# Altium footprint library TYCO THD.PcbLib: 146 footprints (part 2 of 11) (continued)
## TYCO_1-1734282-3 [mm] "Dual Stacked  Plug Over Receptacle Right Angled D-SUB 15 Pins Connector, With Threaded Insert UNC 4-40, And PCB Mount Retention"
height 31.98
pads (32):
  round 5.5 hole 3.2: 16(-16.65,-3.455) 17(16.65,-3.455)
  round 1.7 hole 1: L1(9.695,2.035) L2(6.925,2.035) L3(4.155,2.035) L4(1.385,2.035) L5(-1.385,2.035) L6(-4.155,2.035) L7(-6.925,2.035) L8(-9.695,2.035) L9(8.31,4.875) L10(5.54,4.875) L11(2.77,4.875) L12(0,4.875) L13(-2.77,4.875) L14(-5.54,4.875) L15(-8.31,4.875) U1(-9.695,-4.875) U2(-6.925,-4.875) U3(-4.155,-4.875) U4(-1.385,-4.875) U5(1.385,-4.875) U6(4.155,-4.875) U7(6.925,-4.875) U8(9.695,-4.875) U9(-8.31,-2.035) U10(-5.54,-2.035) U11(-2.77,-2.035) U12(0,-2.035) U13(2.77,-2.035) U14(5.54,-2.035) U15(8.31,-2.035)
Top Overlay:
  lines w0.2: -19.65,12.455 19.65,12.455 ; -19.6,-4.56 -19.6,-6.545 -13.8,-6.545 -13.8,-4.797 ; -19.6,-2.35 -19.6,10.455 ; -19.6,8.285 -13.6,8.285 ; -19.4,8.285 -19.4,7.085 -13.9,7.085 -13.9,8.285 13.9,8.285 13.9,7.085 19.4,7.085 19.4,8.285 ; -13.8,-2.113 -13.8,1.455 -13.6,1.88 ; -13.6,-4.242 -13.6,-6.695 13.6,-6.695 13.6,-4.242 ; -13.6,-2.668 -13.6,10.455 ; -13.087,12.955 -13.087,17.797 cw(c-12.187,17.797) -12.187,18.697 12.187,18.697 cw(c12.187,17.797) 13.087,17.797 13.087,12.955 ; 13.6,-2.668 13.6,10.455 ; 13.6,1.655 13.8,1.455 13.8,-2.113 ; 13.6,8.285 19.6,8.285 ; 13.8,-4.797 13.8,-6.545 19.6,-6.545 19.6,-4.56 ; 19.6,-2.35 19.6,10.451 ; -19.65,10.455 19.65,10.455 19.65,12.955 -19.65,12.955 -19.65,10.455
  text "15" at 9.881,-2.722 h1.5
  text "8" at 10.946,-5.637 h1.5
  text "1" at -11.779,-5.637 h1.5
  text "9" at -11.566,-2.797 h1.5
  text "15" at -12.041,4.163 h1.5
  text "8" at -12.179,1.273 h1.5
  text "1" at 11.346,1.273 h1.5
  text "9" at 9.881,4.188 h1.5
  text "UPPER" at -2.1,-0.65 h1
  text "LOWER" at -2.1,6.26 h1
Mechanical 8:
  lines w0.1: -19.65,12.955 19.65,12.955 ; -17.15,-3.455 -16.65,-3.455 ; -16.65,-3.955 -16.65,-3.455 ; -16.65,-2.955 -16.65,-3.455 ; -16.15,-3.455 -16.65,-3.455 ; -10.195,-4.875 -9.695,-4.875 ; -10.195,2.035 -9.695,2.035 ; -9.695,-5.375 -9.695,-4.875 ; -9.695,-4.375 -9.695,-4.875 ; -9.695,1.535 -9.695,2.035 ; -9.695,2.535 -9.695,2.035 ; -9.195,-4.875 -9.695,-4.875 ; -9.195,2.035 -9.695,2.035 ; -8.81,-2.035 -8.31,-2.035 ; -8.81,4.875 -8.31,4.875 ; -8.31,-2.535 -8.31,-2.035 ; -8.31,-1.535 -8.31,-2.035 ; -8.31,4.375 -8.31,4.875 ; -8.31,5.375 -8.31,4.875 ; -7.81,-2.035 -8.31,-2.035 ; -7.81,4.875 -8.31,4.875 ; -7.425,-4.875 -6.925,-4.875 ; -7.425,2.035 -6.925,2.035 ; -6.925,-5.375 -6.925,-4.875 ; -6.925,-4.375 -6.925,-4.875 ; -6.925,1.535 -6.925,2.035 ; -6.925,2.535 -6.925,2.035 ; -6.425,-4.875 -6.925,-4.875 ; -6.425,2.035 -6.925,2.035 ; -6.04,-2.035 -5.54,-2.035 ; -6.04,4.875 -5.54,4.875 ; -5.54,-2.535 -5.54,-2.035 ; -5.54,-1.535 -5.54,-2.035 ; -5.54,4.375 -5.54,4.875 ; -5.54,5.375 -5.54,4.875 ; -5.04,-2.035 -5.54,-2.035 ; -5.04,4.875 -5.54,4.875 ; -4.655,-4.875 -4.155,-4.875 ; -4.655,2.035 -4.155,2.035 ; -4.155,-5.375 -4.155,-4.875 ; -4.155,-4.375 -4.155,-4.875 ; -4.155,1.535 -4.155,2.035 ; -4.155,2.535 -4.155,2.035 ; -3.655,-4.875 -4.155,-4.875 ; -3.655,2.035 -4.155,2.035 ; -3.27,-2.035 -2.77,-2.035 ; -3.27,4.875 -2.77,4.875 ; -2.77,-2.535 -2.77,-2.035 ; -2.77,-1.535 -2.77,-2.035 ; -2.77,4.375 -2.77,4.875 ; -2.77,5.375 -2.77,4.875 ; -2.27,-2.035 -2.77,-2.035 ; -2.27,4.875 -2.77,4.875 ; -1.885,-4.875 -1.385,-4.875 ; -1.885,2.035 -1.385,2.035 ; -1.385,-5.375 -1.385,-4.875 ; -1.385,-4.375 -1.385,-4.875 ; -1.385,1.535 -1.385,2.035 ; -1.385,2.535 -1.385,2.035 ; -0.885,-4.875 -1.385,-4.875 ; -0.885,2.035 -1.385,2.035 ; -0.5,-2.035 0,-2.035 ; -0.5,0 0,0 ; -0.5,4.875 0,4.875 ; 0,-2.535 0,-2.035 ; 0,-1.535 0,-2.035 ; 0,-0.5 0,0 ; 0,0.5 0,0 ; 0,4.375 0,4.875 ; 0,5.375 0,4.875 ; 0.5,-2.035 0,-2.035 ; 0.5,0 0,0 ; 0.5,4.875 0,4.875 ; 0.885,-4.875 1.385,-4.875 ; 0.885,2.035 1.385,2.035 ; 1.385,-5.375 1.385,-4.875 ; 1.385,-4.375 1.385,-4.875 ; 1.385,1.535 1.385,2.035 ; 1.385,2.535 1.385,2.035 ; 1.885,-4.875 1.385,-4.875 ; 1.885,2.035 1.385,2.035 ; 2.27,-2.035 2.77,-2.035 ; 2.27,4.875 2.77,4.875 ; 2.77,-2.535 2.77,-2.035 ; 2.77,-1.535 2.77,-2.035 ; 2.77,4.375 2.77,4.875 ; 2.77,5.375 2.77,4.875 ; 3.27,-2.035 2.77,-2.035 ; 3.27,4.875 2.77,4.875 ; 3.655,-4.875 4.155,-4.875 ; 3.655,2.035 4.155,2.035 ; 4.155,-5.375 4.155,-4.875 ; 4.155,-4.375 4.155,-4.875 ; 4.155,1.535 4.155,2.035 ; 4.155,2.535 4.155,2.035 ; 4.655,-4.875 4.155,-4.875 ; 4.655,2.035 4.155,2.035 ; 5.04,-2.035 5.54,-2.035 ; 5.04,4.875 5.54,4.875 ; 5.54,-2.535 5.54,-2.035 ; 5.54,-1.535 5.54,-2.035 ; 5.54,4.375 5.54,4.875 ; 5.54,5.375 5.54,4.875 ; 6.04,-2.035 5.54,-2.035 ; 6.04,4.875 5.54,4.875 ; 6.425,-4.875 6.925,-4.875 ; 6.425,2.035 6.925,2.035 ; 6.925,-5.375 6.925,-4.875 ; 6.925,-4.375 6.925,-4.875 ; 6.925,1.535 6.925,2.035 ; 6.925,2.535 6.925,2.035 ; 7.425,-4.875 6.925,-4.875 ; 7.425,2.035 6.925,2.035 ; 7.81,-2.035 8.31,-2.035 ; 7.81,4.875 8.31,4.875 ; 8.31,-2.535 8.31,-2.035 ; 8.31,-1.535 8.31,-2.035 ; 8.31,4.375 8.31,4.875 ; 8.31,5.375 8.31,4.875 ; 8.81,-2.035 8.31,-2.035 ; 8.81,4.875 8.31,4.875 ; 9.195,-4.875 9.695,-4.875 ; 9.195,2.035 9.695,2.035 ; 9.695,-5.375 9.695,-4.875 ; 9.695,-4.375 9.695,-4.875 ; 9.695,1.535 9.695,2.035 ; 9.695,2.535 9.695,2.035 ; 10.195,-4.875 9.695,-4.875 ; 10.195,2.035 9.695,2.035 ; 16.15,-3.455 16.65,-3.455 ; 16.65,-3.955 16.65,-3.455 ; 16.65,-2.955 16.65,-3.455 ; 17.15,-3.455 16.65,-3.455
  text "PCB EDGE" at -3.725,11.475 h1
Mechanical 14:
  circle w0.1: c16.65,-3.455 r1.25
  circle w0.1: c-16.65,-3.455 r1.25
  lines w0.1: -19.65,12.455 19.65,12.455 ; -19.6,8.285 -13.6,8.285 ; -19.6,10.455 -19.6,-6.545 -13.8,-6.545 -13.8,1.455 -13.6,1.88 ; -19.4,8.285 -19.4,7.085 -13.9,7.085 -13.9,8.285 13.9,8.285 13.9,7.085 19.4,7.085 19.4,8.285 ; -17.76,-4.03 -17.3,-4.03 -17.3,-2.88 -17.76,-2.88 ; -17.225,-4.565 -17.225,-4.105 -16.075,-4.105 -16.075,-4.565 ; -17.225,-2.347 -17.225,-2.805 -16.075,-2.805 -16.075,-2.345 ; -15.542,-4.03 -16,-4.03 -16,-2.88 -15.54,-2.88 ; -13.6,10.455 -13.6,-6.695 13.6,-6.695 13.6,10.455 ; -13.087,12.955 -13.087,17.797 cw(c-12.187,17.797) -12.187,18.697 12.187,18.697 cw(c12.187,17.797) 13.087,17.797 13.087,12.955 ; 13.6,1.655 13.8,1.455 13.8,-6.545 19.6,-6.545 19.6,10.451 ; 13.6,8.285 19.6,8.285 ; 15.54,-4.03 16,-4.03 16,-2.88 15.54,-2.88 ; 16.075,-4.565 16.075,-4.105 17.225,-4.105 17.225,-4.565 ; 16.075,-2.347 16.075,-2.805 17.225,-2.805 17.225,-2.345 ; 17.758,-4.03 17.3,-4.03 17.3,-2.88 17.76,-2.88 ; -19.65,10.455 19.65,10.455 19.65,12.955 -19.65,12.955 -19.65,10.455
  text "UPPER" at -2.1,-0.65 h1
  text "LOWER" at -2.1,6.26 h1
  text "9" at 9.881,4.188 h1.5
  text "1" at 11.346,1.273 h1.5
  text "8" at -12.179,1.273 h1.5
  text "15" at -12.041,4.163 h1.5
  text "9" at -11.566,-2.797 h1.5
  text "1" at -11.779,-5.637 h1.5
  text "8" at 10.946,-5.637 h1.5
  text "15" at 9.881,-2.722 h1.5
3D body "TYCO_1-1734282-3.stp": height 31.7, standoff -3.6, extent -19.65,-6.695 19.65,18.755

## TYCO_1-1734285-3 [mm] "Dual Stacked  Right Angled D-SUB 15 Pins Female Connector, With Threaded Insert UNC 4-40, And PCB Mount Retention"
height 31.9
pads (32):
  round 5.5 hole 3.2: 16(-16.65,-3.455) 17(16.65,-3.455)
  round 1.7 hole 1: L1(-9.695,2.035) L2(-6.925,2.035) L3(-4.155,2.035) L4(-1.385,2.035) L5(1.385,2.035) L6(4.155,2.035) L7(6.925,2.035) L8(9.695,2.035) L9(-8.31,4.875) L10(-5.54,4.875) L11(-2.77,4.875) L12(0,4.875) L13(2.77,4.875) L14(5.54,4.875) L15(8.31,4.875) U1(-9.695,-4.875) U2(-6.925,-4.875) U3(-4.155,-4.875) U4(-1.385,-4.875) U5(1.385,-4.875) U6(4.155,-4.875) U7(6.925,-4.875) U8(9.695,-4.875) U9(-8.31,-2.035) U10(-5.54,-2.035) U11(-2.77,-2.035) U12(0,-2.035) U13(2.77,-2.035) U14(5.54,-2.035) U15(8.31,-2.035)
Top Overlay:
  lines w0.2: -19.65,7.355 -12.9,7.355 ; -19.65,10.355 19.65,10.355 ; -19.35,7.355 -19.35,6.691 -13.95,6.691 -13.95,7.355 ; -17.65,10.355 -17.65,12.955 ; -13.2,12.955 ccw(c-13.2,13.855) -12.3,13.855 ; -12.9,-6.545 -19.65,-6.545 -19.65,12.955 19.65,12.955 19.65,-6.545 12.9,-6.545 ; -12.9,10.355 -12.9,-6.695 12.9,-6.695 12.9,10.355 ; -11.3,18.655 -11.3,18.755 11.3,18.755 11.3,18.655 ; -10.8,12.955 -10.8,18.755 ; 10.8,12.955 10.8,18.755 ; 12.9,7.355 19.65,7.355 ; 13.2,12.955 cw(c13.2,13.855) 12.3,13.855 ; 13.95,7.355 13.95,6.691 19.35,6.691 19.35,7.355 ; 17.65,10.355 17.65,12.955 ; -12.3,13.855 -12.3,17.755 ; -12.3,13.855 12.3,13.855 ; -12.3,17.755 cw(c-11.4,17.755) -11.4,18.655 11.399,18.655 cw(c11.4,17.755) 12.3,17.755 ; -12.3,17.755 12.3,17.755 ; 12.3,13.855 12.3,17.755
  text "15" at 9.881,-2.722 h1.5
  text "8" at 10.946,-5.637 h1.5
  text "1" at -11.454,-5.637 h1.5
  text "9" at -11.566,-2.797 h1.5
  text "9" at -11.566,4.113 h1.5
  text "1" at -11.454,1.273 h1.5
  text "8" at 10.946,1.273 h1.5
  text "15" at 9.881,4.188 h1.5
  text "UPPER" at -2.1,-0.65 h1
  text "LOWER" at -2.1,6.26 h1
Mechanical 8:
  lines w0.1: -10.195,-4.875 -9.695,-4.875 ; -10.195,2.035 -9.695,2.035 ; -9.695,-5.375 -9.695,-4.875 ; -9.695,-4.375 -9.695,-4.875 ; -9.695,1.535 -9.695,2.035 ; -9.695,2.535 -9.695,2.035 ; -9.195,-4.875 -9.695,-4.875 ; -9.195,2.035 -9.695,2.035 ; -8.81,-2.035 -8.31,-2.035 ; -8.81,4.875 -8.31,4.875 ; -8.31,-2.535 -8.31,-2.035 ; -8.31,-1.535 -8.31,-2.035 ; -8.31,4.375 -8.31,4.875 ; -8.31,5.375 -8.31,4.875 ; -7.81,-2.035 -8.31,-2.035 ; -7.81,4.875 -8.31,4.875 ; -7.425,-4.875 -6.925,-4.875 ; -7.425,2.035 -6.925,2.035 ; -6.925,-5.375 -6.925,-4.875 ; -6.925,-4.375 -6.925,-4.875 ; -6.925,1.535 -6.925,2.035 ; -6.925,2.535 -6.925,2.035 ; -6.425,-4.875 -6.925,-4.875 ; -6.425,2.035 -6.925,2.035 ; -6.04,-2.035 -5.54,-2.035 ; -6.04,4.875 -5.54,4.875 ; -5.54,-2.535 -5.54,-2.035 ; -5.54,-1.535 -5.54,-2.035 ; -5.54,4.375 -5.54,4.875 ; -5.54,5.375 -5.54,4.875 ; -5.04,-2.035 -5.54,-2.035 ; -5.04,4.875 -5.54,4.875 ; -4.66,-4.875 -4.16,-4.875 ; -4.66,2.035 -4.16,2.035 ; -4.16,-5.375 -4.16,-4.875 ; -4.16,-4.375 -4.16,-4.875 ; -4.16,1.535 -4.16,2.035 ; -4.16,2.535 -4.16,2.035 ; -3.66,-4.875 -4.16,-4.875 ; -3.66,2.035 -4.16,2.035 ; -3.27,-2.035 -2.77,-2.035 ; -3.27,4.875 -2.77,4.875 ; -2.77,-2.535 -2.77,-2.035 ; -2.77,-1.535 -2.77,-2.035 ; -2.77,4.375 -2.77,4.875 ; -2.77,5.375 -2.77,4.875 ; -2.27,-2.035 -2.77,-2.035 ; -2.27,4.875 -2.77,4.875 ; -1.885,-4.875 -1.385,-4.875 ; -1.885,2.035 -1.385,2.035 ; -1.385,-5.375 -1.385,-4.875 ; -1.385,-4.375 -1.385,-4.875 ; -1.385,1.535 -1.385,2.035 ; -1.385,2.535 -1.385,2.035 ; -0.885,-4.875 -1.385,-4.875 ; -0.885,2.035 -1.385,2.035 ; -0.5,-2.035 0,-2.035 ; -0.5,0 0,0 ; -0.5,4.875 0,4.875 ; 0,-2.535 0,-2.035 ; 0,-1.535 0,-2.035 ; 0,-0.5 0,0 ; 0,0.5 0,0 ; 0,4.375 0,4.875 ; 0,5.375 0,4.875 ; 0.5,-2.035 0,-2.035 ; 0.5,0 0,0 ; 0.5,4.875 0,4.875 ; 0.885,-4.875 1.385,-4.875 ; 0.885,2.035 1.385,2.035 ; 1.385,-5.375 1.385,-4.875 ; 1.385,-4.375 1.385,-4.875 ; 1.385,1.535 1.385,2.035 ; 1.385,2.535 1.385,2.035 ; 1.885,-4.875 1.385,-4.875 ; 1.885,2.035 1.385,2.035 ; 2.27,-2.035 2.77,-2.035 ; 2.27,4.875 2.77,4.875 ; 2.77,-2.535 2.77,-2.035 ; 2.77,-1.535 2.77,-2.035 ; 2.77,4.375 2.77,4.875 ; 2.77,5.375 2.77,4.875 ; 3.27,-2.035 2.77,-2.035 ; 3.27,4.875 2.77,4.875 ; 3.655,-4.875 4.155,-4.875 ; 3.655,2.035 4.155,2.035 ; 4.155,-5.375 4.155,-4.875 ; 4.155,-4.375 4.155,-4.875 ; 4.155,1.535 4.155,2.035 ; 4.155,2.535 4.155,2.035 ; 4.655,-4.875 4.155,-4.875 ; 4.655,2.035 4.155,2.035 ; 5.04,-2.035 5.54,-2.035 ; 5.04,4.875 5.54,4.875 ; 5.54,-2.535 5.54,-2.035 ; 5.54,-1.535 5.54,-2.035 ; 5.54,4.375 5.54,4.875 ; 5.54,5.375 5.54,4.875 ; 6.04,-2.035 5.54,-2.035 ; 6.04,4.875 5.54,4.875 ; 6.425,-4.875 6.925,-4.875 ; 6.425,2.035 6.925,2.035 ; 6.925,-5.375 6.925,-4.875 ; 6.925,-4.375 6.925,-4.875 ; 6.925,1.535 6.925,2.035 ; 6.925,2.535 6.925,2.035 ; 7.425,-4.875 6.925,-4.875 ; 7.425,2.035 6.925,2.035 ; 7.81,-2.035 8.31,-2.035 ; 7.81,4.875 8.31,4.875 ; 8.31,-2.535 8.31,-2.035 ; 8.31,-1.535 8.31,-2.035 ; 8.31,4.375 8.31,4.875 ; 8.31,5.375 8.31,4.875 ; 8.81,-2.035 8.31,-2.035 ; 8.81,4.875 8.31,4.875 ; 9.195,-4.875 9.695,-4.875 ; 9.195,2.035 9.695,2.035 ; 9.695,-5.375 9.695,-4.875 ; 9.695,-4.375 9.695,-4.875 ; 9.695,1.535 9.695,2.035 ; 9.695,2.535 9.695,2.035 ; 10.195,-4.875 9.695,-4.875 ; 10.195,2.035 9.695,2.035
Mechanical 14:
  drawing of 6656 lines, arcs and shapes, not listed
  text "UPPER" at -2.1,-0.65 h1
  text "LOWER" at -2.1,6.26 h1
  text "15" at 9.881,4.188 h1.5
  text "8" at 10.946,1.273 h1.5
  text "1" at -11.454,1.273 h1.5
  text "9" at -11.566,4.113 h1.5
  text "9" at -11.566,-2.797 h1.5
  text "1" at -11.454,-5.637 h1.5
  text "8" at 10.946,-5.637 h1.5
  text "15" at 9.881,-2.722 h1.5
3D body "TYCO_1-1734285-3.stp": height 31.6, standoff -3.55, extent -19.65,-6.695 19.65,18.805

## TYCO_1-1734530-1 [mm] "15 Female Contacts, Right Angle High Density D-SUB Connector, AMPLIMITE HD-22 Serie"
height 12.75
pads (17):
  round 1.7 hole 1.2: 1(-4.01,-2.54) 2(-1.72,-2.54) 3(0.57,-2.54) 4(2.86,-2.54) 5(5.15,-2.54) 6(-5.15,0) 7(-2.86,0) 8(-0.57,0) 9(1.72,0) 10(4.01,0) 11(-4.01,2.54) 12(-1.72,2.54) 13(0.57,2.54) 14(2.86,2.54) 15(5.15,2.54)
  round 3.9 hole 3.2: 16(-12.19,0) 17(12.8,0)
Top Overlay:
  lines w0.2: -15.165,7.43 15.785,7.43 ; -15.165,8.43 15.785,8.43 ; -15.09,10.83 -15.09,11.43 15.71,11.43 15.71,10.83 ; -15.04,7.43 -15.04,2.73 -13.79,2.73 -13.79,1.721 ; -14.09,-4.57 -14.09,-1.383 ; -14.09,1.383 -14.09,2.73 ; -14,-1.499 ccw(c-12.19,-0.92) -10.381,-1.499 ; -12.755,2.281 -12.755,2.73 -11.625,2.73 -11.625,2.281 ; -10.59,1.721 -10.59,2.73 -9.34,2.73 -9.34,7.41 ; -10.29,-4.57 -10.29,-1.383 ; -10.29,1.383 -10.29,2.73 ; -9.04,-4.57 -9.04,7.43 ; -7.84,11.43 -7.84,16.54 ; -7.09,17.18 -7.09,17.43 7.71,17.43 7.71,17.18 ; 8.46,11.43 8.46,16.54 ; 9.66,-4.57 9.66,7.43 ; 9.96,7.43 9.96,2.73 11.21,2.73 11.21,1.73 ; 10.91,-4.57 10.91,-1.397 ; 10.91,1.397 10.91,2.73 ; 11.007,-1.519 ccw(c12.81,-0.92) 14.626,-1.48 ; 12.245,2.284 12.245,2.73 13.375,2.73 13.375,2.279 ; 14.41,1.712 14.41,2.73 15.66,2.73 15.66,7.41 ; 14.71,-4.57 14.71,-1.369 ; 14.71,1.369 14.71,2.73 ; -7.84,16.54 cw(c-7.2,16.54) -7.2,17.18 7.82,17.18 cw(c7.82,16.54) 8.46,16.54 ; -7.84,16.54 8.46,16.54 ; -15.165,-4.57 -15.165,10.83 15.785,10.83 15.785,-4.57 -15.165,-4.57
  text "5" at 6.77,-3.24 h1.2
  text "15" at 6.77,1.94 h1.2
  text "10" at 5.69,-0.6 h1.2
  text "6" at -7.72,-0.6 h1.2
  text "11" at -6.834,1.94 h1.2
  text "1" at -6.32,-3.24 h1.2
Mechanical 8:
  circle w0.1: c12.8,0 r1.59
  circle w0.1: c-4.01,2.54 r0.6
  circle w0.1: c-12.19,0 r1.59
  lines w0.1: -12.69,0 -12.19,0 ; -12.19,-0.5 -12.19,0 ; -12.19,0.5 -12.19,0 ; -11.69,0 -12.19,0 ; -5.65,0 -5.15,0 ; -5.15,-0.5 -5.15,0 ; -5.15,0.5 -5.15,0 ; -4.65,0 -5.15,0 ; -4.51,-2.54 -4.01,-2.54 ; -4.51,2.54 -4.01,2.54 ; -4.01,-3.04 -4.01,-2.54 ; -4.01,-2.04 -4.01,-2.54 ; -4.01,2.04 -4.01,2.54 ; -4.01,3.04 -4.01,2.54 ; -3.51,-2.54 -4.01,-2.54 ; -3.51,2.54 -4.01,2.54 ; -3.36,0 -2.86,0 ; -2.86,-0.5 -2.86,0 ; -2.86,0.5 -2.86,0 ; -2.36,0 -2.86,0 ; -2.22,-2.54 -1.72,-2.54 ; -2.22,2.54 -1.72,2.54 ; -1.72,-3.04 -1.72,-2.54 ; -1.72,-2.04 -1.72,-2.54 ; -1.72,2.04 -1.72,2.54 ; -1.72,3.04 -1.72,2.54 ; -1.22,-2.54 -1.72,-2.54 ; -1.22,2.54 -1.72,2.54 ; -1.07,0 -0.57,0 ; -0.57,-0.5 -0.57,0 ; -0.57,0.5 -0.57,0 ; -0.354,-0.354 0,0 ; -0.354,0.354 0,0 ; 0.07,-2.54 0.57,-2.54 ; 0.07,2.54 0.57,2.54 ; 0.354,-0.354 0,0 ; 0.354,0.354 0,0 ; 0.57,-3.04 0.57,-2.54 ; 0.57,-2.04 0.57,-2.54 ; 0.57,2.04 0.57,2.54 ; 0.57,3.04 0.57,2.54 ; 1.07,-2.54 0.57,-2.54 ; 1.07,2.54 0.57,2.54 ; 1.22,0 1.72,0 ; 1.72,-0.5 1.72,0 ; 1.72,0.5 1.72,0 ; 2.22,0 1.72,0 ; 2.36,-2.54 2.86,-2.54 ; 2.36,2.54 2.86,2.54 ; 2.86,-3.04 2.86,-2.54 ; 2.86,-2.04 2.86,-2.54 ; 2.86,2.04 2.86,2.54 ; 2.86,3.04 2.86,2.54 ; 3.36,-2.54 2.86,-2.54 ; 3.36,2.54 2.86,2.54 ; 3.51,0 4.01,0 ; 4.01,-0.5 4.01,0 ; 4.01,0.5 4.01,0 ; 4.51,0 4.01,0 ; 4.65,-2.54 5.15,-2.54 ; 4.65,2.54 5.15,2.54 ; 5.15,-3.04 5.15,-2.54 ; 5.15,-2.04 5.15,-2.54 ; 5.15,2.04 5.15,2.54 ; 5.15,3.04 5.15,2.54 ; 5.65,-2.54 5.15,-2.54 ; 5.65,2.54 5.15,2.54 ; 12.3,0 12.8,0 ; 12.8,-0.5 12.8,0 ; 12.8,0.5 12.8,0 ; 13.3,0 12.8,0
Mechanical 14:
  lines w0.1: -15.165,7.43 15.785,7.43 ; -15.165,8.43 15.785,8.43 ; -15.09,10.83 -15.09,11.43 15.71,11.43 15.71,10.83 ; -15.04,7.43 -15.04,2.73 -13.79,2.73 -13.79,-0.46 ; -14.09,-4.57 -14.09,2.73 ; -14.09,-0.92 ccw(c-12.19,-0.92) -10.29,-0.92 ; -14.09,-0.46 -12.755,-0.46 -12.755,2.73 -11.625,2.73 -11.625,-0.46 -10.29,-0.46 ; -14.09,0.46 -13.79,0.46 ; -10.59,-0.46 -10.59,2.73 -9.34,2.73 -9.34,7.41 ; -10.59,0.46 -10.29,0.46 ; -10.29,-4.57 -10.29,2.73 ; -9.04,-4.57 -9.04,7.43 ; -7.84,11.43 -7.84,16.54 ; -7.09,17.18 -7.09,17.43 7.71,17.43 7.71,17.18 ; 8.46,11.43 8.46,16.54 ; 9.66,-4.57 9.66,7.43 ; 9.96,7.43 9.96,2.73 11.21,2.73 11.21,-0.46 ; 10.91,-4.57 10.91,2.73 ; 10.91,-0.92 ccw(c12.81,-0.92) 14.71,-0.92 ; 10.91,-0.46 12.245,-0.46 12.245,2.73 13.375,2.73 13.375,-0.46 14.71,-0.46 ; 10.91,0.46 11.21,0.46 ; 14.41,-0.46 14.41,2.73 15.66,2.73 15.66,7.41 ; 14.41,0.46 14.71,0.46 ; 14.71,-4.57 14.71,2.73 ; -7.84,16.54 cw(c-7.2,16.54) -7.2,17.18 7.82,17.18 cw(c7.82,16.54) 8.46,16.54 ; -7.84,16.54 8.46,16.54 ; -15.165,-4.57 -15.165,10.83 15.785,10.83 15.785,-4.57 -15.165,-4.57
3D body "TYCO_1-1734530-1.stp": height 12.5, standoff -4.1, extent -15.165,-4.57 15.785,17.48

## TYCO_1-1761685-3 [mm] "40 Contacts, Vertical Low Profile IDC Shrouded Header, with Ejection Latches"
height 9.22
pads (40):
  round 1.6 hole 0.9: 1(-24.13,-1.27) 2(-24.13,1.27) 3(-21.59,-1.27) 4(-21.59,1.27) 5(-19.05,-1.27) 6(-19.05,1.27) 7(-16.51,-1.27) 8(-16.51,1.27) 9(-13.97,-1.27) 10(-13.97,1.27) 11(-11.43,-1.27) 12(-11.43,1.27) 13(-8.89,-1.27) 14(-8.89,1.27) 15(-6.35,-1.27) 16(-6.35,1.27) 17(-3.81,-1.27) 18(-3.81,1.27) 19(-1.27,-1.27) 20(-1.27,1.27) 21(1.27,-1.27) 22(1.27,1.27) 23(3.81,-1.27) 24(3.81,1.27) 25(6.35,-1.27) 26(6.35,1.27) 27(8.89,-1.27) 28(8.89,1.27) 29(11.43,-1.27) 30(11.43,1.27) 31(13.97,-1.27) 32(13.97,1.27) 33(16.51,-1.27) 34(16.51,1.27) 35(19.05,-1.27) 36(19.05,1.27) 37(21.59,-1.27) 38(21.59,1.27) 39(24.13,-1.27) 40(24.13,1.27)
Top Overlay:
  circle w0.3: c-24.125,-5.125 r0.15
  lines w0.2: -34.925,-1.981 -31.261,-1.981 ; -34.925,1.981 -31.261,1.981 ; -27.94,-3.175 -27.94,3.175 ; -26.289,-3.175 -26.289,3.175 ; -26.289,-1.981 -25.4,-1.981 -25.4,1.981 -26.289,1.981 ; -25.682,-1.981 -25.682,1.981 ; -25.4,-3.175 -24.13,-4.318 -22.86,-3.175 ; -2.032,-4.445 -2.032,-2.667 2.032,-2.667 2.032,-4.445 ; -2.032,-3.175 -31.261,-3.175 -31.261,-1.905 -34.11,-1.905 -34.11,1.905 -31.261,1.905 -31.261,3.175 31.261,3.175 31.261,1.905 34.11,1.905 34.11,-1.905 31.261,-1.905 31.261,-3.175 2.032,-3.175 ; 25.682,-1.981 25.682,1.981 ; 26.289,-3.175 26.289,3.175 ; 26.289,-1.981 25.4,-1.981 25.4,1.981 26.289,1.981 ; 27.94,-3.175 27.94,3.175 ; 31.261,-1.981 34.925,-1.981 ; 31.261,1.981 34.925,1.981 ; -34.925,-4.445 -34.925,4.445 -34.131,4.445 cw(c-33.655,4.267) -33.179,4.445 -0.476,4.445 cw(c0,4.267) 0.476,4.445 33.179,4.445 cw(c33.655,4.267) 34.131,4.445 34.925,4.445 34.925,-4.445 -34.925,-4.445
Mechanical 8:
  drawing of 164 lines, arcs and shapes, not listed
Mechanical 14:
  drawing of 205 lines, arcs and shapes, not listed
3D body "TYCO_1-1761685-3.stp": height 17.22, standoff -2.59, extent -34.925,-4.445 34.925,4.775

## TYCO_1-1814655-1 [mm] "16 Positions, Pitch 2.54mm, Width 2.54mm, Heigh 4.4mm, SIP Straight Socket"
height 4.4
pads (16):
  round 1.5 hole 0.8: 1(0,0) 2(2.54,0) 3(5.08,0) 4(7.62,0) 5(10.16,0) 6(12.7,0) 7(15.24,0) 8(17.78,0) 9(20.32,0) 10(22.86,0) 11(25.4,0) 12(27.94,0) 13(30.48,0) 14(33.02,0) 15(35.56,0) 16(38.1,0)
Top Overlay:
  lines w0.2: 1.27,-0.77 1.27,0.77 ; 1.27,-0.77 1.77,-1.27 3.31,-1.27 3.81,-0.77 ; 1.27,-0.77 0.77,-1.27 -0.77,-1.27 -1.27,-0.77 -1.27,0.77 -0.77,1.27 0.77,1.27 1.27,0.77 ; 1.27,0.77 1.77,1.27 3.31,1.27 3.81,0.77 ; 3.81,-0.77 3.81,0.77 ; 3.81,-0.77 4.31,-1.27 5.85,-1.27 6.35,-0.77 ; 3.81,0.77 4.31,1.27 5.85,1.27 6.35,0.77 ; 6.35,-0.77 6.35,0.77 ; 6.35,-0.77 6.85,-1.27 8.39,-1.27 8.89,-0.77 ; 6.35,0.77 6.85,1.27 8.39,1.27 8.89,0.77 ; 8.89,-0.77 8.89,0.77 ; 8.89,-0.77 9.39,-1.27 10.93,-1.27 11.43,-0.77 ; 8.89,0.77 9.39,1.27 10.93,1.27 11.43,0.77 ; 11.43,-0.77 11.43,0.77 ; 11.43,-0.77 11.93,-1.27 13.47,-1.27 13.97,-0.77 ; 11.43,0.77 11.93,1.27 13.47,1.27 13.97,0.77 ; 13.97,-0.77 13.97,0.77 ; 13.97,-0.77 14.47,-1.27 16.01,-1.27 16.51,-0.77 ; 13.97,0.77 14.47,1.27 16.01,1.27 16.51,0.77 ; 16.51,-0.77 16.51,0.77 ; 16.51,-0.77 17.01,-1.27 18.55,-1.27 19.05,-0.77 ; 16.51,0.77 17.01,1.27 18.55,1.27 19.05,0.77 ; 19.05,-0.77 19.05,0.77 ; 19.05,-0.77 19.55,-1.27 21.09,-1.27 21.59,-0.77 ; 19.05,0.77 19.55,1.27 21.09,1.27 21.59,0.77 ; 21.59,-0.77 21.59,0.77 ; 21.59,-0.77 22.09,-1.27 23.63,-1.27 24.13,-0.77 ; 21.59,0.77 22.09,1.27 23.63,1.27 24.13,0.77 ; 24.13,-0.77 24.13,0.77 ; 24.13,-0.77 24.63,-1.27 26.17,-1.27 26.67,-0.77 ; 24.13,0.77 24.63,1.27 26.17,1.27 26.67,0.77 ; 26.67,-0.77 27.17,-1.27 28.71,-1.27 29.21,-0.77 ; 26.67,-0.77 26.67,0.77 ; 26.67,0.77 27.17,1.27 28.71,1.27 29.21,0.77 ; 29.21,-0.77 29.71,-1.27 31.25,-1.27 31.75,-0.77 ; 29.21,-0.77 29.21,0.77 ; 29.21,0.77 29.71,1.27 31.25,1.27 31.75,0.77 ; 31.75,-0.77 32.25,-1.27 33.79,-1.27 34.29,-0.77 ; 31.75,-0.77 31.75,0.77 ; 31.75,0.77 32.25,1.27 33.79,1.27 34.29,0.77 ; 34.29,-0.77 34.29,0.77 ; 34.29,-0.77 34.79,-1.27 36.33,-1.27 36.83,-0.77 ; 34.29,0.77 34.79,1.27 36.33,1.27 36.83,0.77 ; 36.83,-0.77 36.83,0.77 ; 36.83,-0.77 37.33,-1.27 38.87,-1.27 39.37,-0.77 39.37,0.77 38.87,1.27 37.33,1.27 36.83,0.77
Mechanical 8:
  lines w0.1: -1,0 0,0 ; 0,-1 0,0 ; 0,1 0,0 ; 1,0 0,0 ; 1.54,0 2.54,0 ; 2.54,-1 2.54,0 ; 2.54,1 2.54,0 ; 3.54,0 2.54,0 ; 4.08,0 5.08,0 ; 5.08,-1 5.08,0 ; 5.08,1 5.08,0 ; 6.08,0 5.08,0 ; 6.62,0 7.62,0 ; 7.62,-1 7.62,0 ; 7.62,1 7.62,0 ; 8.62,0 7.62,0 ; 9.16,0 10.16,0 ; 10.16,-1 10.16,0 ; 10.16,1 10.16,0 ; 11.16,0 10.16,0 ; 11.7,0 12.7,0 ; 12.7,-1 12.7,0 ; 12.7,1 12.7,0 ; 13.7,0 12.7,0 ; 14.24,0 15.24,0 ; 15.24,-1 15.24,0 ; 15.24,1 15.24,0 ; 16.24,0 15.24,0 ; 16.78,0 17.78,0 ; 17.78,-1 17.78,0 ; 17.78,1 17.78,0 ; 18.78,0 17.78,0 ; 19.32,0 20.32,0 ; 20.32,-1 20.32,0 ; 20.32,1 20.32,0 ; 21.32,0 20.32,0 ; 21.86,0 22.86,0 ; 22.86,-1 22.86,0 ; 22.86,1 22.86,0 ; 23.86,0 22.86,0 ; 24.4,0 25.4,0 ; 25.4,-1 25.4,0 ; 25.4,1 25.4,0 ; 26.4,0 25.4,0 ; 26.94,0 27.94,0 ; 27.94,-1 27.94,0 ; 27.94,1 27.94,0 ; 28.94,0 27.94,0 ; 29.48,0 30.48,0 ; 30.48,-1 30.48,0 ; 30.48,1 30.48,0 ; 31.48,0 30.48,0 ; 32.02,0 33.02,0 ; 33.02,-1 33.02,0 ; 33.02,1 33.02,0 ; 34.02,0 33.02,0 ; 34.56,0 35.56,0 ; 35.56,-1 35.56,0 ; 35.56,1 35.56,0 ; 36.56,0 35.56,0 ; 37.1,0 38.1,0 ; 38.1,-1 38.1,0 ; 38.1,1 38.1,0 ; 39.1,0 38.1,0
Mechanical 14:
  lines w0.1: 1.27,-0.77 1.27,0.77 ; 1.27,-0.77 1.77,-1.27 3.31,-1.27 3.81,-0.77 ; 1.27,-0.77 0.77,-1.27 -0.77,-1.27 -1.27,-0.77 -1.27,0.77 -0.77,1.27 0.77,1.27 1.27,0.77 ; 1.27,0.77 1.77,1.27 3.31,1.27 3.81,0.77 ; 3.81,-0.77 3.81,0.77 ; 3.81,-0.77 4.31,-1.27 5.85,-1.27 6.35,-0.77 ; 3.81,0.77 4.31,1.27 5.85,1.27 6.35,0.77 ; 6.35,-0.77 6.35,0.77 ; 6.35,-0.77 6.85,-1.27 8.39,-1.27 8.89,-0.77 ; 6.35,0.77 6.85,1.27 8.39,1.27 8.89,0.77 ; 8.89,-0.77 8.89,0.77 ; 8.89,-0.77 9.39,-1.27 10.93,-1.27 11.43,-0.77 ; 8.89,0.77 9.39,1.27 10.93,1.27 11.43,0.77 ; 11.43,-0.77 11.43,0.77 ; 11.43,-0.77 11.93,-1.27 13.47,-1.27 13.97,-0.77 ; 11.43,0.77 11.93,1.27 13.47,1.27 13.97,0.77 ; 13.97,-0.77 13.97,0.77 ; 13.97,-0.77 14.47,-1.27 16.01,-1.27 16.51,-0.77 ; 13.97,0.77 14.47,1.27 16.01,1.27 16.51,0.77 ; 16.51,-0.77 16.51,0.77 ; 16.51,-0.77 17.01,-1.27 18.55,-1.27 19.05,-0.77 ; 16.51,0.77 17.01,1.27 18.55,1.27 19.05,0.77 ; 19.05,-0.77 19.05,0.77 ; 19.05,-0.77 19.55,-1.27 21.09,-1.27 21.59,-0.77 ; 19.05,0.77 19.55,1.27 21.09,1.27 21.59,0.77 ; 21.59,-0.77 21.59,0.77 ; 21.59,-0.77 22.09,-1.27 23.63,-1.27 24.13,-0.77 ; 21.59,0.77 22.09,1.27 23.63,1.27 24.13,0.77 ; 24.13,-0.77 24.13,0.77 ; 24.13,-0.77 24.63,-1.27 26.17,-1.27 26.67,-0.77 ; 24.13,0.77 24.63,1.27 26.17,1.27 26.67,0.77 ; 26.67,-0.77 27.17,-1.27 28.71,-1.27 29.21,-0.77 ; 26.67,-0.77 26.67,0.77 ; 26.67,0.77 27.17,1.27 28.71,1.27 29.21,0.77 ; 29.21,-0.77 29.71,-1.27 31.25,-1.27 31.75,-0.77 ; 29.21,-0.77 29.21,0.77 ; 29.21,0.77 29.71,1.27 31.25,1.27 31.75,0.77 ; 31.75,-0.77 32.25,-1.27 33.79,-1.27 34.29,-0.77 ; 31.75,-0.77 31.75,0.77 ; 31.75,0.77 32.25,1.27 33.79,1.27 34.29,0.77 ; 34.29,-0.77 34.29,0.77 ; 34.29,-0.77 34.79,-1.27 36.33,-1.27 36.83,-0.77 ; 34.29,0.77 34.79,1.27 36.33,1.27 36.83,0.77 ; 36.83,-0.77 36.83,0.77 ; 36.83,-0.77 37.33,-1.27 38.87,-1.27 39.37,-0.77 39.37,0.77 38.87,1.27 37.33,1.27 36.83,0.77
3D body "TYCO_1-1814655-1.stp": height 4.4, standoff -2.9, extent -1.27,-1.27 39.37,1.27

## TYCO_1-1814655-1_a [mm] "1 of 16 Positions, Pitch 2.54mm, Width 2.54mm, Heigh 4.4mm, SIP Straight Socket"
height 4.4
pads (1):
  round 1.5 hole 0.8: 1(0,0)
Top Overlay:
  lines w0.2: -1.27,-0.77 -1.27,0.77 -0.77,1.27 0.77,1.27 1.27,0.77 1.27,-0.77 0.77,-1.27 -0.77,-1.27 -1.27,-0.77
Mechanical 8:
  lines w0.1: -1,0 0,0 ; 0,-1 0,0 ; 0,1 0,0 ; 1,0 0,0
Mechanical 14:
  lines w0.1: -1.27,-0.77 -1.27,0.77 -0.77,1.27 0.77,1.27 1.27,0.77 1.27,-0.77 0.77,-1.27 -0.77,-1.27 -1.27,-0.77
3D body "TYCO_1-1814655-1_a.stp": height 4.4, standoff -2.9, extent -1.27,-1.27 1.27,1.27